# Altium footprint library Generic Footprint.PcbLib: 160 footprints (part 9 of 20)
Each footprint in its own frame and in the unit in brackets; x right, y up, seen from the top. Pads: shape width x height; smd on the part's side, far side on the other; paste and mask are expansions set on the pad; w line width, h text height; cw(c..) or ccw(c..) is an arc to the next point about the centre after c.
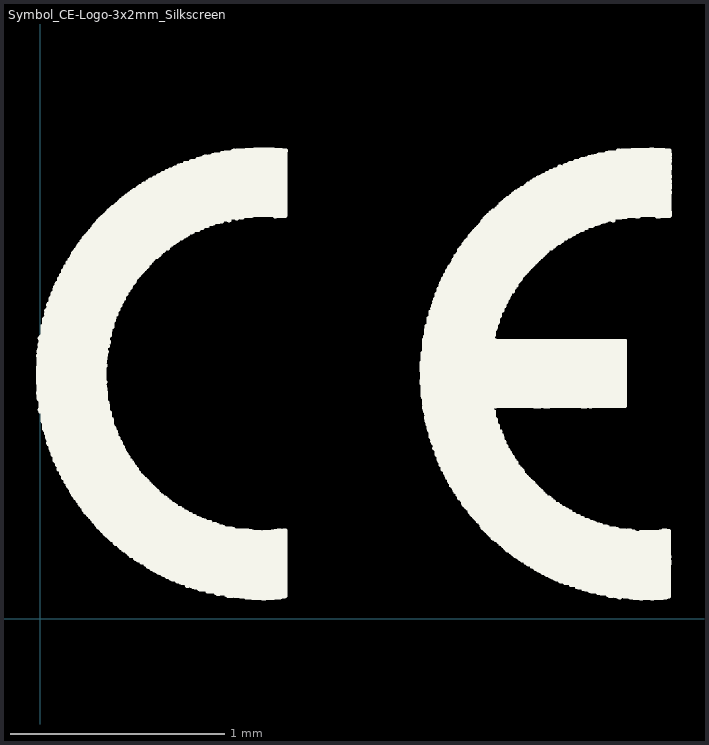
[diagram p8: the footprint, top view; thin cyan lines are the x and y axes]

## Symbol_CE-Logo-3x2mm_Silkscreen [mm]
pads (3108):
  round 0.02 on Top Overlay: 1(-0.01,1.055) 1(-0.01,1.1) 1(-0.01,1.103) 1(-0.01,1.106) 1(-0.01,1.109) 1(-0.01,1.112) 1(-0.01,1.115) 1(-0.01,1.118) 1(-0.01,1.127) 1(-0.01,1.13) 1(-0.01,1.133) 1(-0.01,1.136) 1(-0.01,1.139) 1(-0.01,1.142) 1(-0.01,1.145) 1(-0.01,1.148) 1(-0.01,1.151) 1(-0.01,1.154) 1(-0.01,1.157) 1(-0.01,1.16) 1(-0.01,1.163) 1(-0.01,1.166) 1(-0.01,1.169) 1(-0.01,1.172) 1(-0.01,1.175) 1(-0.01,1.229) 1(-0.007,1.031) 1(-0.007,1.034) 1(-0.007,1.037) 1(-0.007,1.04) 1(-0.007,1.043) 1(-0.007,1.058) 1(-0.007,1.061) 1(-0.007,1.064) 1(-0.007,1.067) 1(-0.007,1.07) 1(-0.007,1.073) 1(-0.007,1.076) 1(-0.007,1.079) 1(-0.007,1.082) 1(-0.007,1.085) 1(-0.007,1.088) 1(-0.007,1.091) 1(-0.007,1.094) 1(-0.007,1.097) 1(-0.007,1.121) 1(-0.007,1.124) 1(-0.007,1.178) 1(-0.007,1.181) 1(-0.007,1.184) 1(-0.007,1.187) 1(-0.007,1.19) 1(-0.007,1.193) 1(-0.007,1.196) 1(-0.007,1.199) 1(-0.007,1.202) 1(-0.007,1.205) 1(-0.007,1.208) 1(-0.007,1.211) 1(-0.007,1.214) 1(-0.007,1.217) 1(-0.007,1.22) 1(-0.007,1.223) 1(-0.007,1.226) 1(-0.007,1.247) 1(-0.007,1.25) 1(-0.004,1.025) 1(-0.004,1.028) 1(-0.004,1.046) 1(-0.004,1.049) 1(-0.004,1.052) 1(-0.004,1.232) 1(-0.004,1.235) 1(-0.004,1.238) 1(-0.004,1.241) 1(-0.004,1.244) 1(-0.004,1.253) 1(-0.004,1.256) 1(-0.004,1.259) 1(-0.001,0.977) 1(-0.001,1.262) 1(-0.001,1.277) 1(-0.001,1.28) 1(-0.001,1.283) 1(-0.001,1.31) 1(0.002,0.968) 1(0.002,0.971) 1(0.002,0.974) 1(0.002,0.986) 1(0.002,0.989) 1(0.002,0.992) 1(0.002,0.995) 1(0.002,0.998) 1(0.002,1.001) 1(0.002,1.004) 1(0.002,1.007) 1(0.002,1.01) 1(0.002,1.013) 1(0.002,1.016) 1(0.002,1.019) 1(0.002,1.022) 1(0.002,1.265) 1(0.002,1.268) 1(0.002,1.271) 1(0.002,1.274) 1(0.002,1.286) 1(0.002,1.289) 1(0.002,1.292) 1(0.002,1.295) 1(0.002,1.298) 1(0.005,0.98) 1(0.005,0.983) 1(0.005,1.301) 1(0.005,1.304) 1(0.005,1.307) 1(0.005,1.313) 1(0.005,1.316) 1(0.005,1.319) 1(0.011,0.926) 1(0.011,0.929) 1(0.011,0.932) 1(0.011,0.935) 1(0.011,0.938) 1(0.011,0.941) 1(0.011,0.944) 1(0.011,0.947) 1(0.011,0.95) 1(0.011,0.953) 1(0.011,0.956) 1(0.011,0.959) 1(0.011,0.965) 1(0.011,1.322) 1(0.011,1.325) 1(0.011,1.328) 1(0.011,1.331) 1(0.011,1.334) 1(0.011,1.337) 1(0.011,1.34) 1(0.011,1.343) 1(0.011,1.346) 1(0.011,1.349) 1(0.011,1.352) 1(0.011,1.355) 1(0.011,1.367) 1(0.014,0.92) 1(0.014,0.923) 1(0.014,0.962) 1(0.014,1.358) 1(0.014,1.361) 1(0.014,1.364) 1(0.02,0.887) 1(0.02,0.893) 1(0.02,0.896) 1(0.02,0.899) 1(0.02,0.902) 1(0.02,0.905) 1(0.02,0.908) 1(0.02,0.911) 1(0.02,0.914) 1(0.02,0.917) 1(0.02,1.37) 1(0.02,1.373) 1(0.02,1.376) 1(0.02,1.379) 1(0.02,1.382) 1(0.02,1.385) 1(0.02,1.388) 1(0.02,1.391) 1(0.02,1.394) 1(0.02,1.4) 1(0.023,0.881) 1(0.023,0.884) 1(0.023,0.89) 1(0.023,1.397) 1(0.023,1.403) 1(0.026,1.406) 1(0.029,0.866) 1(0.029,0.869) 1(0.029,0.872) 1(0.029,0.878) 1(0.029,1.421) 1(0.029,1.424) 1(0.029,1.427) 1(0.029,1.439) 1(0.032,0.848) 1(0.032,0.851) 1(0.032,0.854) 1(0.032,0.857) 1(0.032,0.86) 1(0.032,0.863) 1(0.032,0.875) 1(0.032,1.409) 1(0.032,1.412) 1(0.032,1.415) 1(0.032,1.418) 1(0.032,1.43) 1(0.032,1.433) 1(0.032,1.436) 1(0.035,0.842) 1(0.035,0.845) 1(0.035,1.442) 1(0.035,1.445) 1(0.038,0.821) 1(0.038,1.466) 1(0.041,0.815) 1(0.041,0.818) 1(0.041,0.824) 1(0.041,0.827) 1(0.041,0.83) 1(0.041,0.833) 1(0.041,0.836) 1(0.041,0.839) 1(0.041,1.448) 1(0.041,1.451) 1(0.041,1.454) 1(0.041,1.457) 1(0.041,1.46) 1(0.041,1.463) 1(0.041,1.472) 1(0.044,0.812) 1(0.044,1.469) 1(0.05,0.794) 1(0.05,0.797) 1(0.05,0.8) 1(0.05,0.803) 1(0.05,0.806) 1(0.05,0.809) 1(0.05,1.475) 1(0.05,1.478) 1(0.05,1.481) 1(0.05,1.484) 1(0.05,1.487) 1(0.05,1.49) 1(0.05,1.493) 1(0.05,1.496) 1(0.053,0.785) 1(0.053,0.788) 1(0.053,0.791) 1(0.053,1.499) 1(0.053,1.502) 1(0.056,0.782) 1(0.059,0.767) 1(0.059,0.773) 1(0.059,0.779) 1(0.059,1.505) 1(0.059,1.508) 1(0.059,1.514) 1(0.059,1.52) 1(0.062,0.77) 1(0.062,0.776) 1(0.062,1.511) 1(0.062,1.517) 1(0.065,0.764) 1(0.068,0.74) 1(0.068,0.743) 1(0.068,0.746) 1(0.068,0.749) 1(0.068,0.752) 1(0.068,0.755) 1(0.068,0.758) 1(0.068,0.761) 1(0.068,1.523) 1(0.068,1.526) 1(0.068,1.529) 1(0.068,1.532) 1(0.068,1.535) 1(0.068,1.538) 1(0.068,1.541) 1(0.071,0.737) 1(0.071,1.544) 1(0.071,1.55) 1(0.074,0.734) 1(0.074,1.547) 1(0.077,1.553) 1(0.077,1.562) 1(0.08,0.719) 1(0.08,0.722) 1(0.08,0.725) 1(0.08,0.728) 1(0.08,0.731) 1(0.08,1.556) 1(0.08,1.559) 1(0.08,1.565) 1(0.08,1.568) 1(0.083,0.716) 1(0.086,0.698) 1(0.086,1.571) 1(0.089,0.701) 1(0.089,0.704) 1(0.089,0.707) 1(0.089,0.71) 1(0.089,0.713) 1(0.089,1.574) 1(0.089,1.577) 1(0.089,1.58) 1(0.089,1.583) 1(0.089,1.586) 1(0.089,1.589) 1(0.095,0.695) 1(0.098,0.68) 1(0.098,0.683) 1(0.098,0.686) 1(0.098,0.689) 1(0.098,0.692) 1(0.098,1.592) 1(0.098,1.595) 1(0.098,1.598) 1(0.098,1.601) 1(0.098,1.604) 1(0.101,0.677) 1(0.101,1.607) 1(0.107,0.659) 1(0.107,0.662) 1(0.107,0.665) 1(0.107,0.668) 1(0.107,0.671) 1(0.107,0.674) 1(0.107,1.61) 1(0.107,1.613) 1(0.107,1.616) 1(0.107,1.619) 1(0.107,1.622) 1(0.107,1.625) 1(0.11,1.628) 1(0.113,0.656) 1(0.116,0.653) 1(0.116,1.631) 1(0.116,1.634) 1(0.116,1.64) 1(0.119,0.641) 1(0.119,0.644) 1(0.119,0.647) 1(0.119,0.65) 1(0.119,1.637) 1(0.119,1.643) 1(0.119,1.646) 1(0.122,0.638) 1(0.128,0.626) 1(0.128,0.629) 1(0.128,0.632) 1(0.128,0.635) 1(0.128,1.649) 1(0.128,1.652) 1(0.128,1.655) 1(0.128,1.658) 1(0.128,1.661) 1(0.128,1.664) 1(0.131,0.62) 1(0.131,0.623) 1(0.134,1.667) 1(0.137,0.614) 1(0.137,0.617) 1(0.137,1.67) 1(0.137,1.673) 1(0.137,1.676) 1(0.14,0.611) 1(0.146,0.596) 1(0.146,0.599) 1(0.146,0.602) 1(0.146,0.605) 1(0.146,0.608) 1(0.146,1.679) 1(0.146,1.682) 1(0.146,1.685) 1(0.149,0.59) 1(0.149,0.593) 1(0.149,1.688) 1(0.149,1.691) 1(0.149,1.694) 1(0.155,0.578) 1(0.155,0.581) 1(0.155,0.584) 1(0.155,0.587) 1(0.155,1.697) 1(0.155,1.7) 1(0.155,1.703) 1(0.155,1.706) 1(0.155,1.709) 1(0.158,0.575) 1(0.158,1.712) 1(0.161,0.572) 1(0.161,1.715) 1(0.164,0.566) 1(0.164,0.569) 1(0.164,1.715) 1(0.167,0.563) 1(0.167,1.715) 1(0.167,1.718) 1(0.167,1.721) 1(0.167,1.724) 1(0.173,1.727) 1(0.176,0.551) 1(0.176,0.554) 1(0.176,0.557) 1(0.176,0.56) 1(0.176,1.73) 1(0.176,1.733) 1(0.176,1.736) 1(0.179,1.739) 1(0.179,1.742) 1(0.185,0.536) 1(0.185,0.539) 1(0.185,0.542) 1(0.185,0.545) 1(0.185,0.548) 1(0.185,1.745) 1(0.185,1.748) 1(0.185,1.751) 1(0.188,0.533) 1(0.194,0.527) 1(0.194,0.53) 1(0.194,1.754) 1(0.194,1.757) 1(0.194,1.763) 1(0.197,0.524) 1(0.197,1.76) 1(0.203,0.512) 1(0.203,0.515) 1(0.203,0.518) 1(0.203,0.521) 1(0.203,1.766) 1(0.203,1.769) 1(0.203,1.772) 1(0.203,1.775) 1(0.206,0.506) 1(0.206,0.509) 1(0.206,1.778) 1(0.206,1.781) 1(0.212,0.497) 1(0.212,0.503) 1(0.212,1.784) 1(0.215,0.5) 1(0.215,1.787) 1(0.215,1.79) 1(0.218,0.494) 1(0.224,0.485) 1(0.224,0.488) 1(0.224,0.491) 1(0.224,1.793) 1(0.224,1.796) 1(0.224,1.799) 1(0.227,1.802) 1(0.233,0.476) 1(0.233,0.479) 1(0.233,0.482) 1(0.233,1.805) 1(0.233,1.808) 1(0.233,1.811) 1(0.242,0.467) 1(0.242,0.47) 1(0.242,0.473) 1(0.242,1.814) 1(0.242,1.817) 1(0.242,1.82) 1(0.248,0.464) 1(0.251,0.455) 1(0.251,0.458) 1(0.251,0.461) 1(0.251,1.823) 1(0.251,1.826) 1(0.251,1.829) 1(0.251,1.832) 1(0.254,1.835) 1(0.254,1.838) 1(0.257,0.455) 1(0.26,0.446) 1(0.26,0.455) 1(0.26,1.841) 1(0.263,0.44) 1(0.263,0.443) 1(0.263,0.449) 1(0.263,0.452) 1(0.263,1.844) 1(0.263,1.847) 1(0.266,0.437) 1(0.266,1.85) 1(0.272,0.428) 1(0.272,0.431) 1(0.272,0.434) 1(0.272,1.853) 1(0.272,1.856) 1(0.272,1.859) 1(0.278,0.425) 1(0.281,1.862) 1(0.281,1.865) 1(0.281,1.868) 1(0.284,0.419) 1(0.284,0.422) 1(0.287,0.416) 1(0.29,0.41) 1(0.29,0.413) 1(0.29,1.871) 1(0.29,1.874) 1(0.29,1.877) 1(0.296,0.407) 1(0.299,0.404) 1(0.299,1.091) 1(0.299,1.094) 1(0.299,1.097) 1(0.299,1.1) 1(0.299,1.112) 1(0.299,1.115) 1(0.299,1.118) 1(0.299,1.121) 1(0.299,1.124) 1(0.299,1.127) 1(0.299,1.13) 1(0.299,1.133) 1(0.299,1.136) 1(0.299,1.139) 1(0.299,1.142) 1(0.299,1.145) 1(0.299,1.148) 1(0.299,1.151) 1(0.299,1.154) 1(0.299,1.157) 1(0.299,1.16) 1(0.299,1.163) 1(0.299,1.166) 1(0.299,1.169) 1(0.299,1.172) 1(0.299,1.175) 1(0.299,1.187) 1(0.299,1.19) 1(0.299,1.193) 1(0.299,1.196) 1(0.299,1.88) 1(0.299,1.883) 1(0.302,0.398) 1(0.302,0.401) 1(0.302,1.079) 1(0.302,1.082) 1(0.302,1.085) 1(0.302,1.088) 1(0.302,1.103) 1(0.302,1.109) 1(0.302,1.178) 1(0.302,1.199) 1(0.302,1.202) 1(0.302,1.205) 1(0.302,1.208) 1(0.302,1.211) 1(0.302,1.886) 1(0.305,1.049) 1(0.305,1.052) 1(0.305,1.055) 1(0.305,1.061) 1(0.305,1.064) 1(0.305,1.067) 1(0.305,1.07) 1(0.305,1.073) 1(0.305,1.076) 1(0.305,1.106) 1(0.305,1.181) 1(0.305,1.184) 1(0.305,1.214) 1(0.305,1.217) 1(0.305,1.22) 1(0.305,1.223) 1(0.305,1.226) 1(0.305,1.229) 1(0.305,1.235) 1(0.305,1.238) 1(0.305,1.241) 1(0.305,1.244) 1(0.305,1.256) 1(0.305,1.271) 1(0.308,1.013) 1(0.308,1.016) 1(0.308,1.019) 1(0.308,1.022) 1(0.308,1.025) 1(0.308,1.028) 1(0.308,1.031) 1(0.308,1.034) 1(0.308,1.037) 1(0.308,1.04) 1(0.308,1.043) 1(0.308,1.046) 1(0.308,1.058) 1(0.308,1.232) 1(0.308,1.25) 1(0.308,1.253) 1(0.308,1.259) 1(0.308,1.262) 1(0.308,1.265) 1(0.308,1.268) 1(0.308,1.889) 1(0.311,0.389) 1(0.311,0.392) 1(0.311,0.395) 1(0.311,1.247) 1(0.311,1.274) 1(0.311,1.892) 1(0.311,1.895) 1(0.314,0.992) 1(0.314,1.001) 1(0.314,1.004) 1(0.314,1.007) 1(0.314,1.01) 1(0.314,1.274) 1(0.314,1.277) 1(0.314,1.28) 1(0.314,1.283) 1(0.314,1.898) 1(0.317,0.965) 1(0.317,0.968) 1(0.317,0.971) 1(0.317,0.974) 1(0.317,0.977) 1(0.317,0.98) 1(0.317,0.983) 1(0.317,0.986) 1(0.317,0.989) 1(0.317,0.995) 1(0.317,0.998) 1(0.317,1.274) 1(0.317,1.286) 1(0.317,1.298) 1(0.317,1.301) 1(0.317,1.304) 1(0.317,1.307) 1(0.317,1.31) 1(0.317,1.313) 1(0.317,1.316) 1(0.317,1.319) 1(0.32,0.383) 1(0.32,0.386) 1(0.32,1.289) 1(0.32,1.292) 1(0.32,1.295) 1(0.32,1.322) 1(0.32,1.901) 1(0.32,1.904) 1(0.32,1.907) 1(0.323,0.38) 1(0.323,0.959) 1(0.323,1.331) 1(0.326,0.377) 1(0.326,0.935) 1(0.326,0.938) 1(0.326,0.941) 1(0.326,0.944) 1(0.326,0.947) 1(0.326,0.95) 1(0.326,0.953) 1(0.326,0.956) 1(0.326,0.962) 1(0.326,1.325) 1(0.326,1.328) 1(0.326,1.334) 1(0.326,1.337) 1(0.326,1.34) 1(0.326,1.343) 1(0.326,1.346) 1(0.326,1.358) 1(0.329,0.374) 1(0.329,1.349) 1(0.329,1.352) 1(0.329,1.355) 1(0.329,1.91) 1(0.329,1.913) 1(0.332,0.371) 1(0.332,0.926) 1(0.332,0.929) 1(0.332,1.361) 1(0.332,1.916) 1(0.335,0.368) 1(0.335,0.899) 1(0.335,0.905) 1(0.335,0.908) 1(0.335,0.911) 1(0.335,0.914) 1(0.335,0.917) 1(0.335,0.92) 1(0.335,0.923) 1(0.335,0.932) 1(0.335,1.367) 1(0.335,1.376) 1(0.335,1.379) 1(0.335,1.382) 1(0.338,0.896) 1(0.338,0.902) 1(0.338,1.364) 1(0.338,1.37) 1(0.338,1.373) 1(0.338,1.385) 1(0.338,1.388) 1(0.338,1.919) 1(0.338,1.922) 1(0.341,1.391) 1(0.344,0.881) 1(0.344,0.89) 1(0.344,0.893) 1(0.344,1.394) 1(0.344,1.397) 1(0.344,1.4) 1(0.344,1.403) 1(0.344,1.409) 1(0.344,1.415) 1(0.344,1.925) 1(0.347,0.359) 1(0.347,0.878) 1(0.347,0.884) 1(0.347,0.887) 1(0.347,1.406) 1(0.347,1.412) 1(0.347,1.418) 1(0.35,0.353) 1(0.35,0.356) 1(0.35,0.362) 1(0.35,0.365) 1(0.353,0.35) 1(0.353,0.851) 1(0.353,0.857) 1(0.353,0.866) 1(0.353,0.869) 1(0.353,0.872) 1(0.353,0.875) 1(0.353,1.424) 1(0.353,1.433) 1(0.356,0.848) 1(0.356,0.854) 1(0.356,0.86) 1(0.356,0.863) 1(0.356,1.421) 1(0.356,1.427) 1(0.356,1.43) 1(0.356,1.436) 1(0.356,1.928) 1(0.356,1.934) 1(0.359,1.439) 1(0.359,1.931) 1(0.359,1.937) 1(0.362,1.442) 1(0.365,0.83) 1(0.365,0.833) 1(0.365,0.836) 1(0.365,0.839) 1(0.365,0.842) 1(0.365,0.845) 1(0.365,1.445) 1(0.365,1.448) 1(0.365,1.451) 1(0.365,1.454) 1(0.368,0.341) 1(0.368,0.344) 1(0.368,0.347) 1(0.368,1.457) 1(0.368,1.94) 1(0.368,1.943) 1(0.368,1.946) 1(0.371,1.46) 1(0.374,0.812) 1(0.374,0.815) 1(0.374,0.818) 1(0.374,0.824) 1(0.374,0.827) 1(0.374,1.463) 1(0.374,1.466) 1(0.374,1.469) 1(0.374,1.472) 1(0.377,0.332) 1(0.377,0.335) 1(0.377,0.338) 1(0.377,0.809) 1(0.377,0.821) 1(0.377,1.475) 1(0.377,1.949) 1(0.377,1.952) 1(0.377,1.955) 1(0.38,1.478) 1(0.383,0.329) 1(0.383,0.806) 1(0.383,1.481) 1(0.383,1.484) 1(0.383,1.487) 1(0.386,0.326) 1(0.386,0.791) 1(0.386,0.794) 1(0.386,0.797) 1(0.386,0.8) 1(0.386,0.803) 1(0.386,1.49) 1(0.386,1.493) 1(0.386,1.958) 1(0.389,0.323) 1(0.389,1.961) 1(0.389,1.964) 1(0.392,0.32) 1(0.392,0.776) 1(0.392,0.782) 1(0.392,0.785) 1(0.392,0.788) 1(0.392,1.496) 1(0.392,1.499) 1(0.392,1.502) 1(0.392,1.505) 1(0.392,1.508) 1(0.395,0.32) 1(0.395,0.773) 1(0.395,0.779) 1(0.395,1.511) 1(0.395,1.514) 1(0.395,1.967) 1(0.398,0.32) 1(0.398,1.97) 1(0.401,0.32) 1(0.401,0.764) 1(0.401,0.77) 1(0.401,1.517) 1(0.401,1.973) 1(0.404,0.32) 1(0.404,0.761) 1(0.404,0.767) 1(0.404,1.52) 1(0.404,1.523) 1(0.404,1.526) 1(0.404,1.529) 1(0.404,1.532) 1(0.404,1.976) 1(0.407,0.311) 1(0.407,0.314) 1(0.407,0.317) 1(0.407,1.976) 1(0.41,0.311) 1(0.41,0.758) 1(0.413,0.311) 1(0.413,0.743) 1(0.413,0.746) 1(0.413,0.749) 1(0.413,0.752) 1(0.413,0.755) 1(0.413,1.535) 1(0.413,1.538) 1(0.413,1.541) 1(0.416,0.302) 1(0.416,0.305) 1(0.416,0.308) 1(0.416,1.544) 1(0.416,1.976) 1(0.416,1.979) 1(0.416,1.982) 1(0.416,1.985) 1(0.422,0.737) 1(0.422,0.74) 1(0.422,1.547) 1(0.422,1.55) 1(0.425,0.293) 1(0.425,0.296) 1(0.425,0.299) 1(0.425,0.734) 1(0.425,1.553) 1(0.425,1.556) 1(0.425,1.559) 1(0.425,1.562) 1(0.425,1.988) 1(0.425,1.991) 1(0.428,0.731) 1(0.428,1.994) 1(0.431,0.719) 1(0.431,0.725) 1(0.431,0.728) 1(0.431,1.565) 1(0.434,0.713) 1(0.434,0.716) 1(0.434,0.722) 1(0.434,1.568) 1(0.434,1.571) 1(0.434,1.574) 1(0.437,1.574) 1(0.437,1.997) 1(0.437,2) 1(0.44,1.574) 1(0.44,1.577) 1(0.44,1.583) 1(0.44,1.589) 1(0.44,2.003) 1(0.443,0.284) 1(0.443,0.29) 1(0.443,0.704) 1(0.443,0.707) 1(0.443,0.71) 1(0.443,1.58) 1(0.443,1.586) 1(0.443,1.592) 1(0.446,0.281) 1(0.446,0.287) 1(0.449,0.701) 1(0.452,0.686) 1(0.452,0.689) 1(0.452,0.692) 1(0.452,0.695) 1(0.452,0.698) 1(0.452,1.595) 1(0.452,1.598) 1(0.455,0.275) 1(0.455,0.278) 1(0.455,0.683) 1(0.455,1.601) 1(0.455,2.006) 1(0.455,2.009) 1(0.455,2.012) 1(0.458,0.683) 1(0.458,2.015) 1(0.461,0.272) 1(0.461,0.677) 1(0.461,0.68) 1(0.461,0.683) 1(0.461,1.604) 1(0.461,1.607) 1(0.461,1.61) 1(0.461,2.015) 1(0.464,0.674) 1(0.464,2.015) 1(0.464,2.018) 1(0.467,1.613) 1(0.467,2.021) 1(0.47,0.671) 1(0.47,1.616) 1(0.473,0.266) 1(0.473,0.269) 1(0.473,0.665) 1(0.473,0.668) 1(0.473,1.619) 1(0.476,0.263) 1(0.476,1.622) 1(0.479,0.662) 1(0.479,1.625) 1(0.482,0.656) 1(0.482,0.659) 1(0.482,1.628) 1(0.482,1.631) 1(0.482,2.03) 1(0.485,2.024) 1(0.485,2.027) 1(0.485,2.033) 1(0.488,1.634) 1(0.491,0.647) 1(0.491,0.65) 1(0.491,0.653) 1(0.491,1.637) 1(0.491,1.64) 1(0.494,0.254) 1(0.494,0.257) 1(0.494,0.26) 1(0.497,1.643) 1(0.5,0.635) 1(0.5,0.638) 1(0.5,0.641) 1(0.5,0.644) 1(0.5,1.646) 1(0.5,1.649) 1(0.5,1.652) 1(0.5,1.655) 1(0.5,1.658) 1(0.503,0.245) 1(0.503,0.248) 1(0.503,0.251) 1(0.503,1.661) 1(0.503,2.036) 1(0.503,2.039) 1(0.503,2.042) 1(0.506,1.661) 1(0.509,0.242) 1(0.509,0.626) 1(0.509,0.632) 1(0.509,1.664) 1(0.509,1.667) 1(0.512,0.629) 1(0.512,1.661) 1(0.512,1.67) 1(0.512,2.045) 1(0.512,2.048) 1(0.515,0.242) 1(0.515,1.67) 1(0.515,2.051) 1(0.518,0.62) 1(0.518,0.623) 1(0.518,1.67) 1(0.518,1.676) 1(0.521,0.233) 1(0.521,0.236) 1(0.521,0.242) 1(0.521,0.617) 1(0.521,1.673) 1(0.521,1.679) 1(0.524,0.239) 1(0.527,0.614) 1(0.527,1.685) 1(0.53,0.611) 1(0.53,1.682) 1(0.53,1.688) 1(0.533,0.227) 1(0.533,0.23) 1(0.533,0.608) 1(0.533,2.054) 1(0.533,2.057) 1(0.533,2.06) 1(0.536,0.605) 1(0.539,0.599) 1(0.539,0.602) 1(0.542,0.224) 1(0.545,1.691) 1(0.548,0.59) 1(0.548,0.593) 1(0.548,0.596) 1(0.548,1.694) 1(0.548,1.697) 1(0.551,0.218) 1(0.551,0.221) 1(0.551,0.587) 1(0.551,2.063) 1(0.551,2.066) 1(0.551,2.069) 1(0.557,0.215) 1(0.557,0.578) 1(0.557,0.581) 1(0.557,0.584) 1(0.557,1.7) 1(0.557,1.703) 1(0.557,1.706) 1(0.557,2.072) 1(0.56,1.709) 1(0.566,0.572) 1(0.566,1.712) 1(0.566,1.715) 1(0.566,2.072) 1(0.569,0.212) 1(0.569,0.569) 1(0.569,0.575) 1(0.569,2.072) 1(0.569,2.075) 1(0.569,2.078) 1(0.572,0.209) 1(0.572,2.081) 1(0.575,0.206) 1(0.575,1.718) 1(0.575,1.724) 1(0.578,1.721) 1(0.578,1.727) 1(0.584,0.566) 1(0.587,0.203) 1(0.587,0.56) 1(0.587,0.563) 1(0.59,0.2) 1(0.59,2.084) 1(0.59,2.087) 1(0.59,2.09) 1(0.593,0.197) 1(0.593,0.557) 1(0.596,0.551) 1(0.596,0.554) 1(0.596,1.73) 1(0.596,1.733) 1(0.596,1.736) 1(0.599,0.548) 1(0.602,0.548) 1(0.602,1.739) 1(0.605,0.194) 1(0.605,0.542) 1(0.605,0.548) 1(0.605,1.742) 1(0.605,1.745) 1(0.608,0.191) 1(0.608,0.539) 1(0.608,0.545) 1(0.608,2.093) 1(0.608,2.096) 1(0.608,2.099) 1(0.611,0.188) 1(0.614,1.748) 1(0.614,1.751) 1(0.617,0.185) 1(0.617,1.754) 1(0.62,0.185) 1(0.62,1.757) 1(0.623,0.185) 1(0.623,0.536) 1(0.623,1.757) 1(0.626,0.533) 1(0.626,1.757) 1(0.626,2.102) 1(0.626,2.105) 1(0.629,0.53) 1(0.632,1.76) 1(0.632,2.108) 1(0.635,0.521) 1(0.635,0.524) 1(0.635,0.527) 1(0.635,1.763) 1(0.635,1.766) 1(0.638,0.179) 1(0.638,0.182) 1(0.638,1.766) 1(0.641,0.176) 1(0.641,1.766) 1(0.644,1.769) 1(0.644,1.772) 1(0.647,0.518) 1(0.647,1.775) 1(0.647,2.111) 1(0.647,2.114) 1(0.647,2.117) 1(0.65,0.518) 1(0.653,0.512) 1(0.653,0.515) 1(0.653,0.518) 1(0.656,0.17) 1(0.656,0.173) 1(0.659,2.12) 1(0.662,0.503) 1(0.662,1.778) 1(0.665,0.167) 1(0.665,0.5) 1(0.665,0.506) 1(0.665,0.509) 1(0.665,1.781) 1(0.665,1.784) 1(0.665,2.12) 1(0.668,2.12) 1(0.674,1.787) 1(0.674,2.123) 1(0.677,0.5) 1(0.677,2.126) 1(0.677,2.129) 1(0.68,0.5) 1(0.68,2.129) 1(0.683,0.164) 1(0.683,0.491) 1(0.683,0.494) 1(0.683,1.79) 1(0.683,1.793) 1(0.683,2.129) 1(0.686,0.155) 1(0.686,0.158) 1(0.686,0.161) 1(0.686,0.497) 1(0.689,1.796) 1(0.692,0.155) 1(0.692,1.799) 1(0.692,1.802) 1(0.695,1.805) 1(0.698,1.805) 1(0.704,0.155) 1(0.704,0.482) 1(0.704,0.485) 1(0.704,0.488) 1(0.704,2.132) 1(0.704,2.135) 1(0.707,0.155) 1(0.707,1.805) 1(0.707,2.138) 1(0.71,0.155) 1(0.71,1.811) 1(0.71,2.138) 1(0.713,1.808) 1(0.713,1.814) 1(0.713,2.138) 1(0.716,0.149) 1(0.716,0.152) 1(0.722,0.473) 1(0.722,0.476) 1(0.722,0.479) 1(0.725,0.146) 1(0.734,2.141) 1(0.734,2.144) 1(0.737,0.47) 1(0.737,2.147) 1(0.74,1.817) 1(0.74,1.82) 1(0.743,0.14) 1(0.743,0.143) 1(0.743,1.823) 1(0.746,0.467) 1(0.749,0.137) 1(0.749,0.464) 1(0.752,0.137) 1(0.752,2.15) 1(0.755,0.137) 1(0.755,2.15) 1(0.758,1.826) 1(0.758,1.829) 1(0.761,0.461) 1(0.761,1.832) 1(0.761,2.15) 1(0.761,2.153) 1(0.77,0.452) 1(0.77,0.455) 1(0.77,0.458) 1(0.77,2.156) 1(0.77,2.159) 1(0.773,2.159) 1(0.776,1.835) 1(0.779,0.452) 1(0.779,1.835) 1(0.779,1.838) 1(0.779,1.841) 1(0.782,0.128) 1(0.782,0.131) 1(0.782,0.134) 1(0.782,0.452) 1(0.782,1.835) 1(0.782,1.844) 1(0.785,1.844) 1(0.788,0.128) 1(0.788,2.159) 1(0.791,0.128) 1(0.791,0.452) 1(0.791,2.159) 1(0.794,0.449) 1(0.794,0.452) 1(0.797,0.443) 1(0.797,0.446) 1(0.8,1.844) 1(0.8,2.159) 1(0.803,2.162) 1(0.806,2.165) 1(0.809,1.847) 1(0.809,1.85) 1(0.812,1.853) 1(0.815,0.443) 1(0.815,1.853) 1(0.818,0.44) 1(0.818,0.443) 1(0.818,1.853) 1(0.818,2.168) 1(0.821,0.122) 1(0.821,0.125) 1(0.821,1.853) 1(0.827,1.853) 1(0.83,0.116) 1(0.83,0.119) 1(0.83,0.434) 1(0.83,0.437) 1(0.83,1.853) 1(0.833,0.116) 1(0.833,1.853) 1(0.842,1.856) 1(0.845,1.856) 1(0.848,0.431) 1(0.848,1.856) 1(0.848,1.859) 1(0.848,1.862) 1(0.848,2.174) 1(0.851,2.171) 1(0.857,0.425) 1(0.857,0.428) 1(0.863,2.177) 1(0.869,0.113) 1(0.869,0.116) 1(0.878,0.107) 1(0.878,0.11) 1(0.878,1.865) 1(0.881,0.107) 1(0.881,1.862) 1(0.881,1.865) 1(0.884,1.862) 1(0.884,1.865) 1(0.884,1.868) 1(0.887,1.871) 1(0.893,0.107) 1(0.893,0.422) 1(0.896,0.107) 1(0.899,2.18) 1(0.899,2.183) 1(0.902,0.419) 1(0.905,0.416) 1(0.905,2.186) 1(0.908,0.107) 1(0.908,0.413) 1(0.908,2.186) 1(0.911,0.413) 1(0.914,1.874) 1(0.917,0.107) 1(0.917,0.413) 1(0.917,1.871) 1(0.917,1.874) 1(0.92,1.871) 1(0.92,1.874) 1(0.92,2.186) 1(0.923,0.107) 1(0.923,0.413) 1(0.926,0.107) 1(0.929,0.107) 1(0.938,0.104) 1(0.938,0.413) 1(0.938,1.874) 1(0.941,0.413) 1(0.944,1.874) 1(0.944,1.877) 1(0.944,1.88) 1(0.947,0.413) 1(0.959,0.413) 1(0.962,0.101) 1(0.962,2.189) 1(0.968,0.41) 1(0.968,0.413) 1(0.971,1.883) 1(0.974,1.883) 1(0.974,2.189) 1(0.98,0.41) 1(0.983,0.41) 1(0.983,1.883) 1(0.986,1.883) 1(0.986,2.189) 1(0.989,1.883) 1(0.992,0.098) 1(0.992,0.407) 1(0.992,2.189) 1(0.995,0.404) 1(1.004,0.404) 1(1.004,2.189) 1(1.004,2.192) 1(1.013,0.404) 1(1.019,0.404) 1(1.031,0.404) 1(1.034,0.098) 1(1.037,0.098) 1(1.04,0.095) 1(1.043,0.095) 1(1.043,0.404) 1(1.046,0.095) 1(1.049,0.095) 1(1.07,0.404) 1(1.082,0.098) 1(1.082,0.404) 1(1.082,0.407) 1(1.085,0.098) 1(1.088,0.098) 1(1.088,2.192) 1(1.091,2.189) 1(1.097,0.41) 1(1.097,1.88) 1(1.097,1.883) 1(1.1,0.41) 1(1.1,1.88) 1(1.1,2.189) 1(1.103,1.883) 1(1.106,1.883) 1(1.109,2.189) 1(1.112,0.41) 1(1.112,0.413) 1(1.118,2.189) 1(1.121,0.101) 1(1.121,0.413) 1(1.127,2.189) 